# Altium schematic symbol library jlcpcb_2025_04_inductors_extended_0402.schlib: 1396 symbols (part 4 of 8) (continued)
## MGCI1005T8N2JT-LF
designator L?  Inductance: 8.2nH
Inductor, 8.2nH, ±5%, 350mΩ, 300mA, SMD 0402; Manufacturer: microgate; Manufacturer Part Number: MGCI1005T8N2JT-LF; Package Size: 0402; JLCPCB Basic Part: No; JLCPCB Part Number: C310873; Supplier 1: LCSC; Category: Inductors; Supplier Part Number 1: C310873; Tolerance: ±5%; Rated Current: 300mA; DC Resistance: 350mΩ; RoHS: Yes; ComponentLink1Description: Datasheet; ComponentLink1URL: https://wmsc.lcsc.com/wmsc/upload/file/pdf/v2/lcsc/2304140030_microgate-MGCI1005T8N2JT-LF_C310873.pdf; ComponentLink2Description: JLCPCB Part URL; ComponentLink2URL: https://jlcpcb.com/partdetail/C310873; ComponentLink3Description: LCSC Part URL; ComponentLink3URL: https://lcsc.com/product-detail/Inductors-SMD_microgate-microgate-MGCI1005T8N2JT-LF_C310873.html
footprint IND-0402 (0402 (1005M) Inductor)
pins: 1, 2

## MGCI1005T8N2ST-LF
designator L?  Inductance: 8.2nH
Inductor, 8.2nH, 350mΩ, 300mA, SMD 0402; Manufacturer: microgate; Manufacturer Part Number: MGCI1005T8N2ST-LF; Package Size: 0402; JLCPCB Basic Part: No; JLCPCB Part Number: C281010; Supplier 1: LCSC; Category: Inductors; Supplier Part Number 1: C281010; Rated Current: 300mA; DC Resistance: 350mΩ; RoHS: Yes; ComponentLink1Description: Datasheet; ComponentLink1URL: https://wmsc.lcsc.com/wmsc/upload/file/pdf/v2/lcsc/2304140030_microgate-MGCI1005T8N2ST-LF_C281010.pdf; ComponentLink2Description: JLCPCB Part URL; ComponentLink2URL: https://jlcpcb.com/partdetail/C281010; ComponentLink3Description: LCSC Part URL; ComponentLink3URL: https://lcsc.com/product-detail/Inductors-SMD_microgate-microgate-MGCI1005T8N2ST-LF_C281010.html
footprint IND-0402 (0402 (1005M) Inductor)
pins: 1, 2

## MGCI1005T9N1JT-LF
designator L?  Inductance: 9.1nH
Inductor, 9.1nH, ±5%, 420mΩ, 300mA, SMD 0402; Manufacturer: microgate; Manufacturer Part Number: MGCI1005T9N1JT-LF; Package Size: 0402; JLCPCB Basic Part: No; JLCPCB Part Number: C310874; Supplier 1: LCSC; Category: Inductors; Supplier Part Number 1: C310874; Tolerance: ±5%; Rated Current: 300mA; DC Resistance: 420mΩ; RoHS: Yes; ComponentLink1Description: Datasheet; ComponentLink1URL: https://wmsc.lcsc.com/wmsc/upload/file/pdf/v2/lcsc/2304140030_microgate-MGCI1005T9N1JT-LF_C310874.pdf; ComponentLink2Description: JLCPCB Part URL; ComponentLink2URL: https://jlcpcb.com/partdetail/C310874; ComponentLink3Description: LCSC Part URL; ComponentLink3URL: https://lcsc.com/product-detail/Inductors-SMD_microgate-microgate-MGCI1005T9N1JT-LF_C310874.html
footprint IND-0402 (0402 (1005M) Inductor)
pins: 1, 2

## MGCI1005T9N1ST-LF
designator L?  Inductance: 9.1nH
Inductor, 9.1nH, 420mΩ, 300mA, SMD 0402; Manufacturer: microgate; Manufacturer Part Number: MGCI1005T9N1ST-LF; Package Size: 0402; JLCPCB Basic Part: No; JLCPCB Part Number: C281011; Supplier 1: LCSC; Category: Inductors; Supplier Part Number 1: C281011; Rated Current: 300mA; DC Resistance: 420mΩ; RoHS: Yes; ComponentLink1Description: Datasheet; ComponentLink1URL: https://wmsc.lcsc.com/wmsc/upload/file/pdf/v2/lcsc/2304140030_microgate-MGCI1005T9N1ST-LF_C281011.pdf; ComponentLink2Description: JLCPCB Part URL; ComponentLink2URL: https://jlcpcb.com/partdetail/C281011; ComponentLink3Description: LCSC Part URL; ComponentLink3URL: https://lcsc.com/product-detail/Inductors-SMD_microgate-microgate-MGCI1005T9N1ST-LF_C281011.html
footprint IND-0402 (0402 (1005M) Inductor)
pins: 1, 2

## MGCI1005T10NJT-LF
designator L?  Inductance: 10nH
Inductor, 10nH, ±5%, 420mΩ, 300mA, SMD 0402; Manufacturer: microgate; Manufacturer Part Number: MGCI1005T10NJT-LF; Package Size: 0402; JLCPCB Basic Part: No; JLCPCB Part Number: C280981; Supplier 1: LCSC; Category: Inductors; Supplier Part Number 1: C280981; Tolerance: ±5%; Rated Current: 300mA; DC Resistance: 420mΩ; RoHS: Yes; ComponentLink1Description: Datasheet; ComponentLink1URL: https://wmsc.lcsc.com/wmsc/upload/file/pdf/v2/lcsc/2304140030_microgate-MGCI1005T10NJT-LF_C280981.pdf; ComponentLink2Description: JLCPCB Part URL; ComponentLink2URL: https://jlcpcb.com/partdetail/C280981; ComponentLink3Description: LCSC Part URL; ComponentLink3URL: https://lcsc.com/product-detail/Inductors-SMD_microgate-microgate-MGCI1005T10NJT-LF_C280981.html
footprint IND-0402 (0402 (1005M) Inductor)
pins: 1, 2

## MGCI1005T15NJT-LF
designator L?  Inductance: 15nH
Inductor, 15nH, ±5%, 600mΩ, 300mA, SMD 0402; Manufacturer: microgate; Manufacturer Part Number: MGCI1005T15NJT-LF; Package Size: 0402; JLCPCB Basic Part: No; JLCPCB Part Number: C280983; Supplier 1: LCSC; Category: Inductors; Supplier Part Number 1: C280983; Tolerance: ±5%; Rated Current: 300mA; DC Resistance: 600mΩ; RoHS: Yes; ComponentLink1Description: Datasheet; ComponentLink1URL: https://wmsc.lcsc.com/wmsc/upload/file/pdf/v2/lcsc/2304140030_microgate-MGCI1005T15NJT-LF_C280983.pdf; ComponentLink2Description: JLCPCB Part URL; ComponentLink2URL: https://jlcpcb.com/partdetail/C280983; ComponentLink3Description: LCSC Part URL; ComponentLink3URL: https://lcsc.com/product-detail/Inductors-SMD_microgate-microgate-MGCI1005T15NJT-LF_C280983.html
footprint IND-0402 (0402 (1005M) Inductor)
pins: 1, 2

## MGCI1005T22NJT-LF
designator L?  Inductance: 22nH
Inductor, 22nH, ±5%, 850mΩ, 300mA, SMD 0402; Manufacturer: microgate; Manufacturer Part Number: MGCI1005T22NJT-LF; Package Size: 0402; JLCPCB Basic Part: No; JLCPCB Part Number: C280989; Supplier 1: LCSC; Category: Inductors; Supplier Part Number 1: C280989; Tolerance: ±5%; Rated Current: 300mA; DC Resistance: 850mΩ; RoHS: Yes; ComponentLink1Description: Datasheet; ComponentLink1URL: https://wmsc.lcsc.com/wmsc/upload/file/pdf/v2/lcsc/2304140030_microgate-MGCI1005T22NJT-LF_C280989.pdf; ComponentLink2Description: JLCPCB Part URL; ComponentLink2URL: https://jlcpcb.com/partdetail/C280989; ComponentLink3Description: LCSC Part URL; ComponentLink3URL: https://lcsc.com/product-detail/Inductors-SMD_microgate-microgate-MGCI1005T22NJT-LF_C280989.html
footprint IND-0402 (0402 (1005M) Inductor)
pins: 1, 2

## MGCI1005T27NJT-LF
designator L?  Inductance: 27nH
Inductor, 27nH, ±5%, 1Ω, 300mA, SMD 0402; Manufacturer: microgate; Manufacturer Part Number: MGCI1005T27NJT-LF; Package Size: 0402; JLCPCB Basic Part: No; JLCPCB Part Number: C280990; Supplier 1: LCSC; Category: Inductors; Supplier Part Number 1: C280990; Tolerance: ±5%; Rated Current: 300mA; DC Resistance: 1Ω; RoHS: Yes; ComponentLink1Description: Datasheet; ComponentLink1URL: https://wmsc.lcsc.com/wmsc/upload/file/pdf/v2/lcsc/2304140030_microgate-MGCI1005T27NJT-LF_C280990.pdf; ComponentLink2Description: JLCPCB Part URL; ComponentLink2URL: https://jlcpcb.com/partdetail/C280990; ComponentLink3Description: LCSC Part URL; ComponentLink3URL: https://lcsc.com/product-detail/Inductors-SMD_microgate-microgate-MGCI1005T27NJT-LF_C280990.html
footprint IND-0402 (0402 (1005M) Inductor)
pins: 1, 2

## MGCI1005T33NJT-LF
designator L?  Inductance: 33nH
Inductor, 33nH, ±5%, 1Ω, 200mA, SMD 0402; Manufacturer: microgate; Manufacturer Part Number: MGCI1005T33NJT-LF; Package Size: 0402; JLCPCB Basic Part: No; JLCPCB Part Number: C486325; Supplier 1: LCSC; Category: Inductors; Supplier Part Number 1: C486325; Tolerance: ±5%; Rated Current: 200mA; DC Resistance: 1Ω; RoHS: Yes; ComponentLink1Description: Datasheet; ComponentLink1URL: https://wmsc.lcsc.com/wmsc/upload/file/pdf/v2/lcsc/2304140030_microgate-MGCI1005T33NJT-LF_C486325.pdf; ComponentLink2Description: JLCPCB Part URL; ComponentLink2URL: https://jlcpcb.com/partdetail/C486325; ComponentLink3Description: LCSC Part URL; ComponentLink3URL: https://lcsc.com/product-detail/Inductors-SMD_microgate-microgate-MGCI1005T33NJT-LF_C486325.html
footprint IND-0402 (0402 (1005M) Inductor)
pins: 1, 2

## MGCI1005T39NJT-LF
designator L?  Inductance: 39nH
Inductor, 39nH, ±5%, 1.3Ω, 200mA, SMD 0402; Manufacturer: microgate; Manufacturer Part Number: MGCI1005T39NJT-LF; Package Size: 0402; JLCPCB Basic Part: No; JLCPCB Part Number: C280995; Supplier 1: LCSC; Category: Inductors; Supplier Part Number 1: C280995; Tolerance: ±5%; Rated Current: 200mA; DC Resistance: 1.3Ω; RoHS: Yes; ComponentLink1Description: Datasheet; ComponentLink1URL: https://wmsc.lcsc.com/wmsc/upload/file/pdf/v2/lcsc/2304140030_microgate-MGCI1005T39NJT-LF_C280995.pdf; ComponentLink2Description: JLCPCB Part URL; ComponentLink2URL: https://jlcpcb.com/partdetail/C280995; ComponentLink3Description: LCSC Part URL; ComponentLink3URL: https://lcsc.com/product-detail/Inductors-SMD_microgate-microgate-MGCI1005T39NJT-LF_C280995.html
footprint IND-0402 (0402 (1005M) Inductor)
pins: 1, 2

## MGCI1005T56NJT-LF
designator L?  Inductance: 56nH
Inductor, 56nH, ±5%, 1.8Ω, 200mA, SMD 0402; Manufacturer: microgate; Manufacturer Part Number: MGCI1005T56NJT-LF; Package Size: 0402; JLCPCB Basic Part: No; JLCPCB Part Number: C281002; Supplier 1: LCSC; Category: Inductors; Supplier Part Number 1: C281002; Tolerance: ±5%; Rated Current: 200mA; DC Resistance: 1.8Ω; RoHS: Yes; ComponentLink1Description: Datasheet; ComponentLink1URL: https://wmsc.lcsc.com/wmsc/upload/file/pdf/v2/lcsc/2304140030_microgate-MGCI1005T56NJT-LF_C281002.pdf; ComponentLink2Description: JLCPCB Part URL; ComponentLink2URL: https://jlcpcb.com/partdetail/C281002; ComponentLink3Description: LCSC Part URL; ComponentLink3URL: https://lcsc.com/product-detail/Inductors-SMD_microgate-microgate-MGCI1005T56NJT-LF_C281002.html
footprint IND-0402 (0402 (1005M) Inductor)
pins: 1, 2

## MGCI1005T68NJT-LF
designator L?  Inductance: 68nH
Inductor, 68nH, ±5%, 1.95Ω, 180mA, SMD 0402; Manufacturer: microgate; Manufacturer Part Number: MGCI1005T68NJT-LF; Package Size: 0402; JLCPCB Basic Part: No; JLCPCB Part Number: C281005; Supplier 1: LCSC; Category: Inductors; Supplier Part Number 1: C281005; Tolerance: ±5%; Rated Current: 180mA; DC Resistance: 1.95Ω; RoHS: Yes; ComponentLink1Description: Datasheet; ComponentLink1URL: https://wmsc.lcsc.com/wmsc/upload/file/pdf/v2/lcsc/2304140030_microgate-MGCI1005T68NJT-LF_C281005.pdf; ComponentLink2Description: JLCPCB Part URL; ComponentLink2URL: https://jlcpcb.com/partdetail/C281005; ComponentLink3Description: LCSC Part URL; ComponentLink3URL: https://lcsc.com/product-detail/Inductors-SMD_microgate-microgate-MGCI1005T68NJT-LF_C281005.html
footprint IND-0402 (0402 (1005M) Inductor)
pins: 1, 2

## MGCI1005T82NJT-LF
designator L?  Inductance: 82nH
Inductor, 82nH, ±5%, 2.1Ω, 150mA, SMD 0402; Manufacturer: microgate; Manufacturer Part Number: MGCI1005T82NJT-LF; Package Size: 0402; JLCPCB Basic Part: No; JLCPCB Part Number: C281009; Supplier 1: LCSC; Category: Inductors; Supplier Part Number 1: C281009; Tolerance: ±5%; Rated Current: 150mA; DC Resistance: 2.1Ω; RoHS: Yes; ComponentLink1Description: Datasheet; ComponentLink1URL: https://wmsc.lcsc.com/wmsc/upload/file/pdf/v2/lcsc/2304140030_microgate-MGCI1005T82NJT-LF_C281009.pdf; ComponentLink2Description: JLCPCB Part URL; ComponentLink2URL: https://jlcpcb.com/partdetail/C281009; ComponentLink3Description: LCSC Part URL; ComponentLink3URL: https://lcsc.com/product-detail/Inductors-SMD_microgate-microgate-MGCI1005T82NJT-LF_C281009.html
footprint IND-0402 (0402 (1005M) Inductor)
pins: 1, 2

## MGCI1005TR10JT-LF
designator L?  Inductance: 100nH
Inductor, 100nH, ±5%, 2.5Ω, 150mA, SMD 0402; Manufacturer: microgate; Manufacturer Part Number: MGCI1005TR10JT-LF; Package Size: 0402; JLCPCB Basic Part: No; JLCPCB Part Number: C281012; Supplier 1: LCSC; Category: Inductors; Supplier Part Number 1: C281012; Tolerance: ±5%; Rated Current: 150mA; DC Resistance: 2.5Ω; RoHS: Yes; ComponentLink1Description: Datasheet; ComponentLink1URL: https://wmsc.lcsc.com/wmsc/upload/file/pdf/v2/lcsc/2304140030_microgate-MGCI1005TR10JT-LF_C281012.pdf; ComponentLink2Description: JLCPCB Part URL; ComponentLink2URL: https://jlcpcb.com/partdetail/C281012; ComponentLink3Description: LCSC Part URL; ComponentLink3URL: https://lcsc.com/product-detail/Inductors-SMD_microgate-microgate-MGCI1005TR10JT-LF_C281012.html
footprint IND-0402 (0402 (1005M) Inductor)
pins: 1, 2

## MGCI1005TR12JT-LF
designator L?  Inductance: 120nH
Inductor, 120nH, ±5%, 2.8Ω, 150mA, SMD 0402; Manufacturer: microgate; Manufacturer Part Number: MGCI1005TR12JT-LF; Package Size: 0402; JLCPCB Basic Part: No; JLCPCB Part Number: C281013; Supplier 1: LCSC; Category: Inductors; Supplier Part Number 1: C281013; Tolerance: ±5%; Rated Current: 150mA; DC Resistance: 2.8Ω; RoHS: Yes; ComponentLink1Description: Datasheet; ComponentLink1URL: https://wmsc.lcsc.com/wmsc/upload/file/pdf/v2/lcsc/2304140030_microgate-MGCI1005TR12JT-LF_C281013.pdf; ComponentLink2Description: JLCPCB Part URL; ComponentLink2URL: https://jlcpcb.com/partdetail/C281013; ComponentLink3Description: LCSC Part URL; ComponentLink3URL: https://lcsc.com/product-detail/Inductors-SMD_microgate-microgate-MGCI1005TR12JT-LF_C281013.html
footprint IND-0402 (0402 (1005M) Inductor)
pins: 1, 2

## MGCI1005TR15JT-LF
designator L?  Inductance: 150nH
Inductor, 150nH, ±5%, 2.35Ω, 150mA, SMD 0402; Manufacturer: microgate; Manufacturer Part Number: MGCI1005TR15JT-LF; Package Size: 0402; JLCPCB Basic Part: No; JLCPCB Part Number: C486326; Supplier 1: LCSC; Category: Inductors; Supplier Part Number 1: C486326; Tolerance: ±5%; Rated Current: 150mA; DC Resistance: 2.35Ω; RoHS: Yes; ComponentLink1Description: Datasheet; ComponentLink1URL: https://wmsc.lcsc.com/wmsc/upload/file/pdf/v2/lcsc/2002201432_microgate-MGCI1005TR15JT-LF_C486326.pdf; ComponentLink2Description: JLCPCB Part URL; ComponentLink2URL: https://jlcpcb.com/partdetail/C486326; ComponentLink3Description: LCSC Part URL; ComponentLink3URL: https://lcsc.com/product-detail/Inductors-SMD_microgate-microgate-MGCI1005TR15JT-LF_C486326.html
footprint IND-0402 (0402 (1005M) Inductor)
pins: 1, 2

## MGCI1005TR18JT-LF
designator L?  Inductance: 180nH
Inductor, 180nH, ±5%, 2.55Ω, 100mA, SMD 0402; Manufacturer: microgate; Manufacturer Part Number: MGCI1005TR18JT-LF; Package Size: 0402; JLCPCB Basic Part: No; JLCPCB Part Number: C281014; Supplier 1: LCSC; Category: Inductors; Supplier Part Number 1: C281014; Tolerance: ±5%; Rated Current: 100mA; DC Resistance: 2.55Ω; RoHS: Yes; ComponentLink1Description: Datasheet; ComponentLink1URL: https://wmsc.lcsc.com/wmsc/upload/file/pdf/v2/lcsc/2304140030_microgate-MGCI1005TR18JT-LF_C281014.pdf; ComponentLink2Description: JLCPCB Part URL; ComponentLink2URL: https://jlcpcb.com/partdetail/C281014; ComponentLink3Description: LCSC Part URL; ComponentLink3URL: https://lcsc.com/product-detail/Inductors-SMD_microgate-microgate-MGCI1005TR18JT-LF_C281014.html
footprint IND-0402 (0402 (1005M) Inductor)
pins: 1, 2

## MGCI1005TR22JT-LF
designator L?  Inductance: 220nH
Inductor, 220nH, ±5%, 2.65Ω, 100mA, SMD 0402; Manufacturer: microgate; Manufacturer Part Number: MGCI1005TR22JT-LF; Package Size: 0402; JLCPCB Basic Part: No; JLCPCB Part Number: C281015; Supplier 1: LCSC; Category: Inductors; Supplier Part Number 1: C281015; Tolerance: ±5%; Rated Current: 100mA; DC Resistance: 2.65Ω; RoHS: Yes; ComponentLink1Description: Datasheet; ComponentLink1URL: https://wmsc.lcsc.com/wmsc/upload/file/pdf/v2/lcsc/2304140030_microgate-MGCI1005TR22JT-LF_C281015.pdf; ComponentLink2Description: JLCPCB Part URL; ComponentLink2URL: https://jlcpcb.com/partdetail/C281015; ComponentLink3Description: LCSC Part URL; ComponentLink3URL: https://lcsc.com/product-detail/Inductors-SMD_microgate-microgate-MGCI1005TR22JT-LF_C281015.html
footprint IND-0402 (0402 (1005M) Inductor)
pins: 1, 2

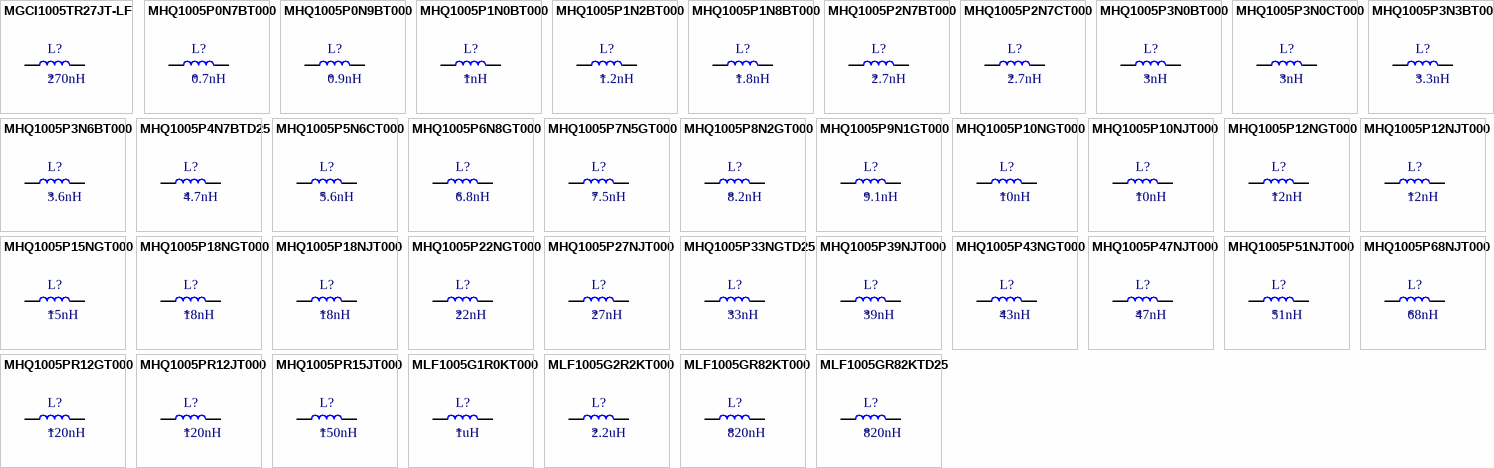
[diagram p18: symbols MGCI1005TR27JT-LF to MLF1005GR82KTD25]

## MGCI1005TR27JT-LF
designator L?  Inductance: 270nH
Inductor, 270nH, ±5%, 2.85Ω, 50mA, SMD 0402; Manufacturer: microgate; Manufacturer Part Number: MGCI1005TR27JT-LF; Package Size: 0402; JLCPCB Basic Part: No; JLCPCB Part Number: C281016; Supplier 1: LCSC; Category: Inductors; Supplier Part Number 1: C281016; Tolerance: ±5%; Rated Current: 50mA; DC Resistance: 2.85Ω; RoHS: Yes; ComponentLink1Description: Datasheet; ComponentLink1URL: https://wmsc.lcsc.com/wmsc/upload/file/pdf/v2/lcsc/2304140030_microgate-MGCI1005TR27JT-LF_C281016.pdf; ComponentLink2Description: JLCPCB Part URL; ComponentLink2URL: https://jlcpcb.com/partdetail/C281016; ComponentLink3Description: LCSC Part URL; ComponentLink3URL: https://lcsc.com/product-detail/Inductors-SMD_microgate-microgate-MGCI1005TR27JT-LF_C281016.html
footprint IND-0402 (0402 (1005M) Inductor)
pins: 1, 2

## MHQ1005P0N7BT000
designator L?  Inductance: 0.7nH
Inductor, 0.7nH, 10mΩ, 1.2A, SMD 0402; Manufacturer: TDK; Manufacturer Part Number: MHQ1005P0N7BT000; Self-Resonant Frequency: 18.3GHz; Package Size: 0402; JLCPCB Basic Part: No; JLCPCB Part Number: C307689; Supplier 1: LCSC; Category: Inductors; Supplier Part Number 1: C307689; Rated Current: 1.2A; DC Resistance: 10mΩ; RoHS: Yes; ComponentLink1Description: Datasheet; ComponentLink1URL: https://wmsc.lcsc.com/wmsc/upload/file/pdf/v2/lcsc/2304140030_TDK-MHQ1005P0N7BT000_C307689.pdf; ComponentLink2Description: JLCPCB Part URL; ComponentLink2URL: https://jlcpcb.com/partdetail/C307689; ComponentLink3Description: LCSC Part URL; ComponentLink3URL: https://lcsc.com/product-detail/Inductors-SMD_TDK-TDK-MHQ1005P0N7BT000_C307689.html
footprint IND-0402 (0402 (1005M) Inductor)
pins: 1, 2

## MHQ1005P0N9BT000
designator L?  Inductance: 0.9nH
Inductor, 0.9nH, 10mΩ, 1.2A, SMD 0402; Manufacturer: TDK; Manufacturer Part Number: MHQ1005P0N9BT000; Self-Resonant Frequency: 15GHz; Package Size: 0402; JLCPCB Basic Part: No; JLCPCB Part Number: C695587; Supplier 1: LCSC; Category: Inductors; Supplier Part Number 1: C695587; Rated Current: 1.2A; DC Resistance: 10mΩ; RoHS: Yes; ComponentLink1Description: Datasheet; ComponentLink1URL: https://wmsc.lcsc.com/wmsc/upload/file/pdf/v2/lcsc/2304140030_TDK-MHQ1005P0N9BT000_C695587.pdf; ComponentLink2Description: JLCPCB Part URL; ComponentLink2URL: https://jlcpcb.com/partdetail/C695587; ComponentLink3Description: LCSC Part URL; ComponentLink3URL: https://lcsc.com/product-detail/Inductors-SMD_TDK-TDK-MHQ1005P0N9BT000_C695587.html
footprint IND-0402 (0402 (1005M) Inductor)
pins: 1, 2

## MHQ1005P1N0BT000
designator L?  Inductance: 1nH
Inductor, 1nH, 10mΩ, 1.2A, SMD 0402; Manufacturer: TDK; Manufacturer Part Number: MHQ1005P1N0BT000; Self-Resonant Frequency: 15GHz; Package Size: 0402; JLCPCB Basic Part: No; JLCPCB Part Number: C433003; Supplier 1: LCSC; Category: Inductors; Supplier Part Number 1: C433003; Rated Current: 1.2A; DC Resistance: 10mΩ; RoHS: Yes; ComponentLink1Description: Datasheet; ComponentLink1URL: https://wmsc.lcsc.com/wmsc/upload/file/pdf/v2/lcsc/2304140030_TDK-MHQ1005P1N0BT000_C433003.pdf; ComponentLink2Description: JLCPCB Part URL; ComponentLink2URL: https://jlcpcb.com/partdetail/C433003; ComponentLink3Description: LCSC Part URL; ComponentLink3URL: https://lcsc.com/product-detail/Inductors-SMD_TDK-TDK-MHQ1005P1N0BT000_C433003.html
footprint IND-0402 (0402 (1005M) Inductor)
pins: 1, 2

## MHQ1005P1N2BT000
designator L?  Inductance: 1.2nH
Inductor, 1.2nH, 10mΩ, 1.2A, SMD 0402; Manufacturer: TDK; Manufacturer Part Number: MHQ1005P1N2BT000; Self-Resonant Frequency: 13GHz; Package Size: 0402; JLCPCB Basic Part: No; JLCPCB Part Number: C445745; Supplier 1: LCSC; Category: Inductors; Supplier Part Number 1: C445745; Rated Current: 1.2A; DC Resistance: 10mΩ; RoHS: Yes; ComponentLink1Description: Datasheet; ComponentLink1URL: https://wmsc.lcsc.com/wmsc/upload/file/pdf/v2/lcsc/2304140030_TDK-MHQ1005P1N2BT000_C445745.pdf; ComponentLink2Description: JLCPCB Part URL; ComponentLink2URL: https://jlcpcb.com/partdetail/C445745; ComponentLink3Description: LCSC Part URL; ComponentLink3URL: https://lcsc.com/product-detail/Inductors-SMD_TDK-TDK-MHQ1005P1N2BT000_C445745.html
footprint IND-0402 (0402 (1005M) Inductor)
pins: 1, 2

## MHQ1005P1N8BT000
designator L?  Inductance: 1.8nH
Inductor, 1.8nH, 30mΩ, 1A, SMD 0402; Manufacturer: TDK; Manufacturer Part Number: MHQ1005P1N8BT000; Self-Resonant Frequency: 9GHz; Q Factor: 23@250MHz; Package Size: 0402; JLCPCB Basic Part: No; JLCPCB Part Number: C531405; Supplier 1: LCSC; Category: Inductors; Supplier Part Number 1: C531405; Rated Current: 1A; DC Resistance: 30mΩ; RoHS: Yes; ComponentLink1Description: Datasheet; ComponentLink1URL: https://wmsc.lcsc.com/wmsc/upload/file/pdf/v2/lcsc/2401221724_TDK-MHQ1005P1N8BT000_C531405.pdf; ComponentLink2Description: JLCPCB Part URL; ComponentLink2URL: https://jlcpcb.com/partdetail/C531405; ComponentLink3Description: LCSC Part URL; ComponentLink3URL: https://lcsc.com/product-detail/Inductors-SMD_TDK-TDK-MHQ1005P1N8BT000_C531405.html
footprint IND-0402 (0402 (1005M) Inductor)
pins: 1, 2

## MHQ1005P2N7BT000
designator L?  Inductance: 2.7nH
Inductor, 2.7nH, 40mΩ, 900mA, SMD 0402; Manufacturer: TDK; Manufacturer Part Number: MHQ1005P2N7BT000; Self-Resonant Frequency: 9.6GHz; Q Factor: 23@250MHz; Package Size: 0402; JLCPCB Basic Part: No; JLCPCB Part Number: C434826; Supplier 1: LCSC; Category: Inductors; Supplier Part Number 1: C434826; Rated Current: 900mA; DC Resistance: 40mΩ; RoHS: Yes; ComponentLink1Description: Datasheet; ComponentLink1URL: https://wmsc.lcsc.com/wmsc/upload/file/pdf/v2/lcsc/2304140030_TDK-MHQ1005P2N7BT000_C434826.pdf; ComponentLink2Description: JLCPCB Part URL; ComponentLink2URL: https://jlcpcb.com/partdetail/C434826; ComponentLink3Description: LCSC Part URL; ComponentLink3URL: https://lcsc.com/product-detail/Inductors-SMD_TDK-TDK-MHQ1005P2N7BT000_C434826.html
footprint IND-0402 (0402 (1005M) Inductor)
pins: 1, 2

## MHQ1005P2N7CT000
designator L?  Inductance: 2.7nH
Inductor, 2.7nH, 40mΩ, 900mA, SMD 0402; Manufacturer: TDK; Manufacturer Part Number: MHQ1005P2N7CT000; Self-Resonant Frequency: 6.5GHz; Q Factor: 23@250MHz; Package Size: 0402; JLCPCB Basic Part: No; JLCPCB Part Number: C434841; Supplier 1: LCSC; Category: Inductors; Supplier Part Number 1: C434841; Rated Current: 900mA; DC Resistance: 40mΩ; RoHS: Yes; ComponentLink1Description: Datasheet; ComponentLink1URL: https://wmsc.lcsc.com/wmsc/upload/file/pdf/v2/lcsc/2304140030_TDK-MHQ1005P2N7CT000_C434841.pdf; ComponentLink2Description: JLCPCB Part URL; ComponentLink2URL: https://jlcpcb.com/partdetail/C434841; ComponentLink3Description: LCSC Part URL; ComponentLink3URL: https://lcsc.com/product-detail/Inductors-SMD_TDK-TDK-MHQ1005P2N7CT000_C434841.html
footprint IND-0402 (0402 (1005M) Inductor)
pins: 1, 2

## MHQ1005P3N0BT000
designator L?  Inductance: 3nH
Inductor, 3nH, 60mΩ, 900mA, SMD 0402; Manufacturer: TDK; Manufacturer Part Number: MHQ1005P3N0BT000; Self-Resonant Frequency: 6GHz; Q Factor: 23@250MHz; Package Size: 0402; JLCPCB Basic Part: No; JLCPCB Part Number: C433005; Supplier 1: LCSC; Category: Inductors; Supplier Part Number 1: C433005; Rated Current: 900mA; DC Resistance: 60mΩ; RoHS: Yes; ComponentLink1Description: Datasheet; ComponentLink1URL: https://wmsc.lcsc.com/wmsc/upload/file/pdf/v2/lcsc/2304140030_TDK-MHQ1005P3N0BT000_C433005.pdf; ComponentLink2Description: JLCPCB Part URL; ComponentLink2URL: https://jlcpcb.com/partdetail/C433005; ComponentLink3Description: LCSC Part URL; ComponentLink3URL: https://lcsc.com/product-detail/Inductors-SMD_TDK-TDK-MHQ1005P3N0BT000_C433005.html
footprint IND-0402 (0402 (1005M) Inductor)
pins: 1, 2

## MHQ1005P3N0CT000
designator L?  Inductance: 3nH
Inductor, 3nH, 60mΩ, 900mA, SMD 0402; Manufacturer: TDK; Manufacturer Part Number: MHQ1005P3N0CT000; Self-Resonant Frequency: 6GHz; Q Factor: 23@250MHz; Package Size: 0402; JLCPCB Basic Part: No; JLCPCB Part Number: C445744; Supplier 1: LCSC; Category: Inductors; Supplier Part Number 1: C445744; Rated Current: 900mA; DC Resistance: 60mΩ; RoHS: Yes; ComponentLink1Description: Datasheet; ComponentLink1URL: https://wmsc.lcsc.com/wmsc/upload/file/pdf/v2/lcsc/2304140030_TDK-MHQ1005P3N0CT000_C445744.pdf; ComponentLink2Description: JLCPCB Part URL; ComponentLink2URL: https://jlcpcb.com/partdetail/C445744; ComponentLink3Description: LCSC Part URL; ComponentLink3URL: https://lcsc.com/product-detail/Inductors-SMD_TDK-TDK-MHQ1005P3N0CT000_C445744.html
footprint IND-0402 (0402 (1005M) Inductor)
pins: 1, 2

## MHQ1005P3N3BT000
designator L?  Inductance: 3.3nH
Inductor, 3.3nH, 60mΩ, 900mA, SMD 0402; Manufacturer: TDK; Manufacturer Part Number: MHQ1005P3N3BT000; Self-Resonant Frequency: 9GHz; Q Factor: 23@250MHz; Package Size: 0402; JLCPCB Basic Part: No; JLCPCB Part Number: C531332; Supplier 1: LCSC; Category: Inductors; Supplier Part Number 1: C531332; Rated Current: 900mA; DC Resistance: 60mΩ; RoHS: Yes; ComponentLink1Description: Datasheet; ComponentLink1URL: https://wmsc.lcsc.com/wmsc/upload/file/pdf/v2/lcsc/2304140030_TDK-MHQ1005P3N3BT000_C531332.pdf; ComponentLink2Description: JLCPCB Part URL; ComponentLink2URL: https://jlcpcb.com/partdetail/C531332; ComponentLink3Description: LCSC Part URL; ComponentLink3URL: https://lcsc.com/product-detail/Inductors-SMD_TDK-TDK-MHQ1005P3N3BT000_C531332.html
footprint IND-0402 (0402 (1005M) Inductor)
pins: 1, 2

## MHQ1005P3N6BT000
designator L?  Inductance: 3.6nH
Inductor, 3.6nH, 70mΩ, 900mA, SMD 0402; Manufacturer: TDK; Manufacturer Part Number: MHQ1005P3N6BT000; Self-Resonant Frequency: 5.5GHz; Q Factor: 23@250MHz; Package Size: 0402; JLCPCB Basic Part: No; JLCPCB Part Number: C531406; Supplier 1: LCSC; Category: Inductors; Supplier Part Number 1: C531406; Rated Current: 900mA; DC Resistance: 70mΩ; RoHS: Yes; ComponentLink1Description: Datasheet; ComponentLink1URL: https://wmsc.lcsc.com/wmsc/upload/file/pdf/v2/lcsc/2401221724_TDK-MHQ1005P3N6BT000_C531406.pdf; ComponentLink2Description: JLCPCB Part URL; ComponentLink2URL: https://jlcpcb.com/partdetail/C531406; ComponentLink3Description: LCSC Part URL; ComponentLink3URL: https://lcsc.com/product-detail/Inductors-SMD_TDK-TDK-MHQ1005P3N6BT000_C531406.html
footprint IND-0402 (0402 (1005M) Inductor)
pins: 1, 2

## MHQ1005P4N7BTD25
designator L?  Inductance: 4.7nH
Inductor, 4.7nH, 80mΩ, 800mA, SMD 0402; Manufacturer: TDK; Manufacturer Part Number: MHQ1005P4N7BTD25; Self-Resonant Frequency: 5GHz; Q Factor: 23@250MHz; Package Size: 0402; JLCPCB Basic Part: No; JLCPCB Part Number: C2048654; Supplier 1: LCSC; Category: Inductors; Supplier Part Number 1: C2048654; Rated Current: 800mA; DC Resistance: 80mΩ; RoHS: Yes; ComponentLink1Description: Datasheet; ComponentLink1URL: https://wmsc.lcsc.com/wmsc/upload/file/pdf/v2/lcsc/2304140030_TDK-MHQ1005P4N7BTD25_C2048654.pdf; ComponentLink2Description: JLCPCB Part URL; ComponentLink2URL: https://jlcpcb.com/partdetail/C2048654; ComponentLink3Description: LCSC Part URL; ComponentLink3URL: https://lcsc.com/product-detail/Inductors-SMD_TDK-TDK-MHQ1005P4N7BTD25_C2048654.html
footprint IND-0402 (0402 (1005M) Inductor)
pins: 1, 2

## MHQ1005P5N6CT000
designator L?  Inductance: 5.6nH
Inductor, 5.6nH, 100mΩ, 800mA, SMD 0402; Manufacturer: TDK; Manufacturer Part Number: MHQ1005P5N6CT000; Self-Resonant Frequency: 4.5GHz; Q Factor: 23@250MHz; Package Size: 0402; JLCPCB Basic Part: No; JLCPCB Part Number: C2050782; Supplier 1: LCSC; Category: Inductors; Supplier Part Number 1: C2050782; Rated Current: 800mA; DC Resistance: 100mΩ; RoHS: Yes; ComponentLink1Description: Datasheet; ComponentLink1URL: https://wmsc.lcsc.com/wmsc/upload/file/pdf/v2/lcsc/2304140030_TDK-MHQ1005P5N6CT000_C2050782.pdf; ComponentLink2Description: JLCPCB Part URL; ComponentLink2URL: https://jlcpcb.com/partdetail/C2050782; ComponentLink3Description: LCSC Part URL; ComponentLink3URL: https://lcsc.com/product-detail/Inductors-SMD_TDK-TDK-MHQ1005P5N6CT000_C2050782.html
footprint IND-0402 (0402 (1005M) Inductor)
pins: 1, 2

## MHQ1005P6N8GT000
designator L?  Inductance: 6.8nH
Inductor, 6.8nH, ±2%, 100mΩ, 700mA, SMD 0402; Manufacturer: TDK; Manufacturer Part Number: MHQ1005P6N8GT000; Self-Resonant Frequency: 5.8GHz; Q Factor: 23@250MHz; Package Size: 0402; JLCPCB Basic Part: No; JLCPCB Part Number: C445747; Supplier 1: LCSC; Category: Inductors; Supplier Part Number 1: C445747; Tolerance: ±2%; Rated Current: 700mA; DC Resistance: 100mΩ; RoHS: Yes; ComponentLink1Description: Datasheet; ComponentLink1URL: https://wmsc.lcsc.com/wmsc/upload/file/pdf/v2/lcsc/2304140030_TDK-MHQ1005P6N8GT000_C445747.pdf; ComponentLink2Description: JLCPCB Part URL; ComponentLink2URL: https://jlcpcb.com/partdetail/C445747; ComponentLink3Description: LCSC Part URL; ComponentLink3URL: https://lcsc.com/product-detail/Inductors-SMD_TDK-TDK-MHQ1005P6N8GT000_C445747.html
footprint IND-0402 (0402 (1005M) Inductor)
pins: 1, 2

## MHQ1005P7N5GT000
designator L?  Inductance: 7.5nH
Inductor, 7.5nH, ±2%, 120mΩ, 600mA, SMD 0402; Manufacturer: TDK; Manufacturer Part Number: MHQ1005P7N5GT000; Self-Resonant Frequency: 5.6GHz; Q Factor: 23@250MHz; Package Size: 0402; JLCPCB Basic Part: No; JLCPCB Part Number: C531336; Supplier 1: LCSC; Category: Inductors; Supplier Part Number 1: C531336; Tolerance: ±2%; Rated Current: 600mA; DC Resistance: 120mΩ; RoHS: Yes; ComponentLink1Description: Datasheet; ComponentLink1URL: https://wmsc.lcsc.com/wmsc/upload/file/pdf/v2/lcsc/2304140030_TDK-MHQ1005P7N5GT000_C531336.pdf; ComponentLink2Description: JLCPCB Part URL; ComponentLink2URL: https://jlcpcb.com/partdetail/C531336; ComponentLink3Description: LCSC Part URL; ComponentLink3URL: https://lcsc.com/product-detail/Inductors-SMD_TDK-TDK-MHQ1005P7N5GT000_C531336.html
footprint IND-0402 (0402 (1005M) Inductor)
pins: 1, 2

## MHQ1005P8N2GT000
designator L?  Inductance: 8.2nH
Inductor, 8.2nH, ±2%, 120mΩ, 550mA, SMD 0402; Manufacturer: TDK; Manufacturer Part Number: MHQ1005P8N2GT000; Self-Resonant Frequency: 3.6GHz; Q Factor: 23@250MHz; Package Size: 0402; JLCPCB Basic Part: No; JLCPCB Part Number: C413898; Supplier 1: LCSC; Category: Inductors; Supplier Part Number 1: C413898; Tolerance: ±2%; Rated Current: 550mA; DC Resistance: 120mΩ; RoHS: Yes; ComponentLink1Description: Datasheet; ComponentLink1URL: https://wmsc.lcsc.com/wmsc/upload/file/pdf/v2/lcsc/2304140030_TDK-MHQ1005P8N2GT000_C413898.pdf; ComponentLink2Description: JLCPCB Part URL; ComponentLink2URL: https://jlcpcb.com/partdetail/C413898; ComponentLink3Description: LCSC Part URL; ComponentLink3URL: https://lcsc.com/product-detail/Inductors-SMD_TDK-TDK-MHQ1005P8N2GT000_C413898.html
footprint IND-0402 (0402 (1005M) Inductor)
pins: 1, 2

## MHQ1005P9N1GT000
designator L?  Inductance: 9.1nH
Inductor, 9.1nH, ±2%, 130mΩ, 550mA, SMD 0402; Manufacturer: TDK; Manufacturer Part Number: MHQ1005P9N1GT000; Self-Resonant Frequency: 4.5GHz; Q Factor: 23@250MHz; Package Size: 0402; JLCPCB Basic Part: No; JLCPCB Part Number: C434847; Supplier 1: LCSC; Category: Inductors; Supplier Part Number 1: C434847; Tolerance: ±2%; Rated Current: 550mA; DC Resistance: 130mΩ; RoHS: Yes; ComponentLink1Description: Datasheet; ComponentLink1URL: https://wmsc.lcsc.com/wmsc/upload/file/pdf/v2/lcsc/2304140030_TDK-MHQ1005P9N1GT000_C434847.pdf; ComponentLink2Description: JLCPCB Part URL; ComponentLink2URL: https://jlcpcb.com/partdetail/C434847; ComponentLink3Description: LCSC Part URL; ComponentLink3URL: https://lcsc.com/product-detail/Inductors-SMD_TDK-TDK-MHQ1005P9N1GT000_C434847.html
footprint IND-0402 (0402 (1005M) Inductor)
pins: 1, 2

## MHQ1005P10NGT000
designator L?  Inductance: 10nH
Inductor, 10nH, ±2%, 150mΩ, 500mA, SMD 0402; Manufacturer: TDK; Manufacturer Part Number: MHQ1005P10NGT000; Self-Resonant Frequency: 3.3GHz; Q Factor: 23@250MHz; Package Size: 0402; JLCPCB Basic Part: No; JLCPCB Part Number: C382409; Supplier 1: LCSC; Category: Inductors; Supplier Part Number 1: C382409; Tolerance: ±2%; Rated Current: 500mA; DC Resistance: 150mΩ; RoHS: Yes; ComponentLink1Description: Datasheet; ComponentLink1URL: https://wmsc.lcsc.com/wmsc/upload/file/pdf/v2/lcsc/2304140030_TDK-MHQ1005P10NGT000_C382409.pdf; ComponentLink2Description: JLCPCB Part URL; ComponentLink2URL: https://jlcpcb.com/partdetail/C382409; ComponentLink3Description: LCSC Part URL; ComponentLink3URL: https://lcsc.com/product-detail/Inductors-SMD_TDK-TDK-MHQ1005P10NGT000_C382409.html
footprint IND-0402 (0402 (1005M) Inductor)
pins: 1, 2

## MHQ1005P10NJT000
designator L?  Inductance: 10nH
Inductor, 10nH, ±5%, 150mΩ, 500mA, SMD 0402; Manufacturer: TDK; Manufacturer Part Number: MHQ1005P10NJT000; Self-Resonant Frequency: 4.6GHz; Q Factor: 23@250MHz; Package Size: 0402; JLCPCB Basic Part: No; JLCPCB Part Number: C445746; Supplier 1: LCSC; Category: Inductors; Supplier Part Number 1: C445746; Tolerance: ±5%; Rated Current: 500mA; DC Resistance: 150mΩ; RoHS: Yes; ComponentLink1Description: Datasheet; ComponentLink1URL: https://wmsc.lcsc.com/wmsc/upload/file/pdf/v2/lcsc/2304140030_TDK-MHQ1005P10NJT000_C445746.pdf; ComponentLink2Description: JLCPCB Part URL; ComponentLink2URL: https://jlcpcb.com/partdetail/C445746; ComponentLink3Description: LCSC Part URL; ComponentLink3URL: https://lcsc.com/product-detail/Inductors-SMD_TDK-TDK-MHQ1005P10NJT000_C445746.html
footprint IND-0402 (0402 (1005M) Inductor)
pins: 1, 2

## MHQ1005P12NGT000
designator L?  Inductance: 12nH
Inductor, 12nH, ±2%, 240mΩ, 450mA, SMD 0402; Manufacturer: TDK; Manufacturer Part Number: MHQ1005P12NGT000; Self-Resonant Frequency: 2.8GHz; Q Factor: 23@250MHz; Package Size: 0402; JLCPCB Basic Part: No; JLCPCB Part Number: C3911363; Supplier 1: LCSC; Category: Inductors; Supplier Part Number 1: C3911363; Tolerance: ±2%; Rated Current: 450mA; DC Resistance: 240mΩ; RoHS: Yes; ComponentLink1Description: Datasheet; ComponentLink1URL: https://wmsc.lcsc.com/wmsc/upload/file/pdf/v2/lcsc/2401221719_TDK-MHQ1005P12NGT000_C3911363.pdf; ComponentLink2Description: JLCPCB Part URL; ComponentLink2URL: https://jlcpcb.com/partdetail/C3911363; ComponentLink3Description: LCSC Part URL; ComponentLink3URL: https://lcsc.com/product-detail/Inductors-SMD_TDK-TDK-MHQ1005P12NGT000_C3911363.html
footprint IND-0402 (0402 (1005M) Inductor)
pins: 1, 2

## MHQ1005P12NJT000
designator L?  Inductance: 12nH
Inductor, 12nH, ±5%, 190mΩ, 450mA, SMD 0402; Manufacturer: TDK; Manufacturer Part Number: MHQ1005P12NJT000; Self-Resonant Frequency: 3.8GHz; Q Factor: 23@250MHz; Package Size: 0402; JLCPCB Basic Part: No; JLCPCB Part Number: C695588; Supplier 1: LCSC; Category: Inductors; Supplier Part Number 1: C695588; Tolerance: ±5%; Rated Current: 450mA; DC Resistance: 190mΩ; RoHS: Yes; ComponentLink1Description: Datasheet; ComponentLink1URL: https://wmsc.lcsc.com/wmsc/upload/file/pdf/v2/lcsc/2304140030_TDK-MHQ1005P12NJT000_C695588.pdf; ComponentLink2Description: JLCPCB Part URL; ComponentLink2URL: https://jlcpcb.com/partdetail/C695588; ComponentLink3Description: LCSC Part URL; ComponentLink3URL: https://lcsc.com/product-detail/Inductors-SMD_TDK-TDK-MHQ1005P12NJT000_C695588.html
footprint IND-0402 (0402 (1005M) Inductor)
pins: 1, 2

## MHQ1005P15NGT000
designator L?  Inductance: 15nH
Inductor, 15nH, ±2%, 220mΩ, 400mA, SMD 0402; Manufacturer: TDK; Manufacturer Part Number: MHQ1005P15NGT000; Self-Resonant Frequency: 2.3GHz; Q Factor: 23@250MHz; Package Size: 0402; JLCPCB Basic Part: No; JLCPCB Part Number: C387862; Supplier 1: LCSC; Category: Inductors; Supplier Part Number 1: C387862; Tolerance: ±2%; Rated Current: 400mA; DC Resistance: 220mΩ; RoHS: Yes; ComponentLink1Description: Datasheet; ComponentLink1URL: https://wmsc.lcsc.com/wmsc/upload/file/pdf/v2/lcsc/2304140030_TDK-MHQ1005P15NGT000_C387862.pdf; ComponentLink2Description: JLCPCB Part URL; ComponentLink2URL: https://jlcpcb.com/partdetail/C387862; ComponentLink3Description: LCSC Part URL; ComponentLink3URL: https://lcsc.com/product-detail/Inductors-SMD_TDK-TDK-MHQ1005P15NGT000_C387862.html
footprint IND-0402 (0402 (1005M) Inductor)
pins: 1, 2

## MHQ1005P18NGT000
designator L?  Inductance: 18nH
Inductor, 18nH, ±2%, 480mΩ, 260mA, SMD 0402; Manufacturer: TDK; Manufacturer Part Number: MHQ1005P18NGT000; Self-Resonant Frequency: 2.3GHz; Q Factor: 22@250MHz; Package Size: 0402; JLCPCB Basic Part: No; JLCPCB Part Number: C695589; Supplier 1: LCSC; Category: Inductors; Supplier Part Number 1: C695589; Tolerance: ±2%; Rated Current: 260mA; DC Resistance: 480mΩ; RoHS: Yes; ComponentLink1Description: Datasheet; ComponentLink1URL: https://wmsc.lcsc.com/wmsc/upload/file/pdf/v2/lcsc/2304140030_TDK-MHQ1005P18NGT000_C695589.pdf; ComponentLink2Description: JLCPCB Part URL; ComponentLink2URL: https://jlcpcb.com/partdetail/C695589; ComponentLink3Description: LCSC Part URL; ComponentLink3URL: https://lcsc.com/product-detail/Inductors-SMD_TDK-TDK-MHQ1005P18NGT000_C695589.html
footprint IND-0402 (0402 (1005M) Inductor)
pins: 1, 2

## MHQ1005P18NJT000
designator L?  Inductance: 18nH
Inductor, 18nH, ±5%, 480mΩ, 260mA, SMD 0402; Manufacturer: TDK; Manufacturer Part Number: MHQ1005P18NJT000; Self-Resonant Frequency: 2.3GHz; Q Factor: 22@250MHz; Package Size: 0402; JLCPCB Basic Part: No; JLCPCB Part Number: C434824; Supplier 1: LCSC; Category: Inductors; Supplier Part Number 1: C434824; Tolerance: ±5%; Rated Current: 260mA; DC Resistance: 480mΩ; RoHS: Yes; ComponentLink1Description: Datasheet; ComponentLink1URL: https://wmsc.lcsc.com/wmsc/upload/file/pdf/v2/lcsc/2304140030_TDK-MHQ1005P18NJT000_C434824.pdf; ComponentLink2Description: JLCPCB Part URL; ComponentLink2URL: https://jlcpcb.com/partdetail/C434824; ComponentLink3Description: LCSC Part URL; ComponentLink3URL: https://lcsc.com/product-detail/Inductors-SMD_TDK-TDK-MHQ1005P18NJT000_C434824.html
footprint IND-0402 (0402 (1005M) Inductor)
pins: 1, 2

## MHQ1005P22NGT000
designator L?  Inductance: 22nH
Inductor, 22nH, ±2%, 660mΩ, 230mA, SMD 0402; Manufacturer: TDK; Manufacturer Part Number: MHQ1005P22NGT000; Self-Resonant Frequency: 2.9GHz; Q Factor: 20@250MHz; Package Size: 0402; JLCPCB Basic Part: No; JLCPCB Part Number: C695590; Supplier 1: LCSC; Category: Inductors; Supplier Part Number 1: C695590; Tolerance: ±2%; Rated Current: 230mA; DC Resistance: 660mΩ; RoHS: Yes; ComponentLink1Description: Datasheet; ComponentLink1URL: https://wmsc.lcsc.com/wmsc/upload/file/pdf/v2/lcsc/2304140030_TDK-MHQ1005P22NGT000_C695590.pdf; ComponentLink2Description: JLCPCB Part URL; ComponentLink2URL: https://jlcpcb.com/partdetail/C695590; ComponentLink3Description: LCSC Part URL; ComponentLink3URL: https://lcsc.com/product-detail/Inductors-SMD_TDK-TDK-MHQ1005P22NGT000_C695590.html
footprint IND-0402 (0402 (1005M) Inductor)
pins: 1, 2

## MHQ1005P27NJT000
designator L?  Inductance: 27nH
Inductor, 27nH, ±5%, 660mΩ, 230mA, SMD 0402; Manufacturer: TDK; Manufacturer Part Number: MHQ1005P27NJT000; Self-Resonant Frequency: 2.6GHz; Q Factor: 20@250MHz; Package Size: 0402; JLCPCB Basic Part: No; JLCPCB Part Number: C524923; Supplier 1: LCSC; Category: Inductors; Supplier Part Number 1: C524923; Tolerance: ±5%; Rated Current: 230mA; DC Resistance: 660mΩ; RoHS: Yes; ComponentLink1Description: Datasheet; ComponentLink1URL: https://wmsc.lcsc.com/wmsc/upload/file/pdf/v2/lcsc/2304140030_TDK-MHQ1005P27NJT000_C524923.pdf; ComponentLink2Description: JLCPCB Part URL; ComponentLink2URL: https://jlcpcb.com/partdetail/C524923; ComponentLink3Description: LCSC Part URL; ComponentLink3URL: https://lcsc.com/product-detail/Inductors-SMD_TDK-TDK-MHQ1005P27NJT000_C524923.html
footprint IND-0402 (0402 (1005M) Inductor)
pins: 1, 2

## MHQ1005P33NGTD25
designator L?  Inductance: 33nH
Inductor, 33nH, ±2%, 740mΩ, 220mA, SMD 0402; Manufacturer: TDK; Manufacturer Part Number: MHQ1005P33NGTD25; Self-Resonant Frequency: 2.3GHz; Q Factor: 20@250MHz; Package Size: 0402; JLCPCB Basic Part: No; JLCPCB Part Number: C880690; Supplier 1: LCSC; Category: Inductors; Supplier Part Number 1: C880690; Tolerance: ±2%; Rated Current: 220mA; DC Resistance: 740mΩ; RoHS: Yes; ComponentLink1Description: Datasheet; ComponentLink1URL: https://wmsc.lcsc.com/wmsc/upload/file/pdf/v2/lcsc/2010170834_TDK-MHQ1005P33NGTD25_C880690.pdf; ComponentLink2Description: JLCPCB Part URL; ComponentLink2URL: https://jlcpcb.com/partdetail/C880690; ComponentLink3Description: LCSC Part URL; ComponentLink3URL: https://lcsc.com/product-detail/Inductors-SMD_TDK-TDK-MHQ1005P33NGTD25_C880690.html
footprint IND-0402 (0402 (1005M) Inductor)
pins: 1, 2

## MHQ1005P39NJT000
designator L?  Inductance: 39nH
Inductor, 39nH, ±5%, 950mΩ, 190mA, SMD 0402; Manufacturer: TDK; Manufacturer Part Number: MHQ1005P39NJT000; Self-Resonant Frequency: 1.4GHz; Q Factor: 20@250MHz; Package Size: 0402; JLCPCB Basic Part: No; JLCPCB Part Number: C531399; Supplier 1: LCSC; Category: Inductors; Supplier Part Number 1: C531399; Tolerance: ±5%; Rated Current: 190mA; DC Resistance: 950mΩ; RoHS: Yes; ComponentLink1Description: Datasheet; ComponentLink1URL: https://wmsc.lcsc.com/wmsc/upload/file/pdf/v2/lcsc/2401221724_TDK-MHQ1005P39NJT000_C531399.pdf; ComponentLink2Description: JLCPCB Part URL; ComponentLink2URL: https://jlcpcb.com/partdetail/C531399; ComponentLink3Description: LCSC Part URL; ComponentLink3URL: https://lcsc.com/product-detail/Inductors-SMD_TDK-TDK-MHQ1005P39NJT000_C531399.html
footprint IND-0402 (0402 (1005M) Inductor)
pins: 1, 2

## MHQ1005P43NGT000
designator L?  Inductance: 43nH
Inductor, 43nH, ±2%, 1.06Ω, 190mA, SMD 0402; Manufacturer: TDK; Manufacturer Part Number: MHQ1005P43NGT000; Self-Resonant Frequency: 2GHz; Q Factor: 22@250MHz; Package Size: 0402; JLCPCB Basic Part: No; JLCPCB Part Number: C695591; Supplier 1: LCSC; Category: Inductors; Supplier Part Number 1: C695591; Tolerance: ±2%; Rated Current: 190mA; DC Resistance: 1.06Ω; RoHS: Yes; ComponentLink1Description: Datasheet; ComponentLink1URL: https://wmsc.lcsc.com/wmsc/upload/file/pdf/v2/lcsc/2304140030_TDK-MHQ1005P43NGT000_C695591.pdf; ComponentLink2Description: JLCPCB Part URL; ComponentLink2URL: https://jlcpcb.com/partdetail/C695591; ComponentLink3Description: LCSC Part URL; ComponentLink3URL: https://lcsc.com/product-detail/Inductors-SMD_TDK-TDK-MHQ1005P43NGT000_C695591.html
footprint IND-0402 (0402 (1005M) Inductor)
pins: 1, 2

## MHQ1005P47NJT000
designator L?  Inductance: 47nH
Inductor, 47nH, ±5%, 1.09Ω, 190mA, SMD 0402; Manufacturer: TDK; Manufacturer Part Number: MHQ1005P47NJT000; Self-Resonant Frequency: 1.3GHz; Q Factor: 22@250MHz; Package Size: 0402; JLCPCB Basic Part: No; JLCPCB Part Number: C445743; Supplier 1: LCSC; Category: Inductors; Supplier Part Number 1: C445743; Tolerance: ±5%; Rated Current: 190mA; DC Resistance: 1.09Ω; RoHS: Yes; ComponentLink1Description: Datasheet; ComponentLink1URL: https://wmsc.lcsc.com/wmsc/upload/file/pdf/v2/lcsc/2304140030_TDK-MHQ1005P47NJT000_C445743.pdf; ComponentLink2Description: JLCPCB Part URL; ComponentLink2URL: https://jlcpcb.com/partdetail/C445743; ComponentLink3Description: LCSC Part URL; ComponentLink3URL: https://lcsc.com/product-detail/Inductors-SMD_TDK-TDK-MHQ1005P47NJT000_C445743.html
footprint IND-0402 (0402 (1005M) Inductor)
pins: 1, 2

## MHQ1005P51NJT000
designator L?  Inductance: 51nH
Inductor, 51nH, ±5%, 1.17Ω, 190mA, SMD 0402; Manufacturer: TDK; Manufacturer Part Number: MHQ1005P51NJT000; Self-Resonant Frequency: 1.8GHz; Q Factor: 22@250MHz; Package Size: 0402; JLCPCB Basic Part: No; JLCPCB Part Number: C480646; Supplier 1: LCSC; Category: Inductors; Supplier Part Number 1: C480646; Tolerance: ±5%; Rated Current: 190mA; DC Resistance: 1.17Ω; RoHS: Yes; ComponentLink1Description: Datasheet; ComponentLink1URL: https://wmsc.lcsc.com/wmsc/upload/file/pdf/v2/lcsc/2304140030_TDK-MHQ1005P51NJT000_C480646.pdf; ComponentLink2Description: JLCPCB Part URL; ComponentLink2URL: https://jlcpcb.com/partdetail/C480646; ComponentLink3Description: LCSC Part URL; ComponentLink3URL: https://lcsc.com/product-detail/Inductors-SMD_TDK-TDK-MHQ1005P51NJT000_C480646.html
footprint IND-0402 (0402 (1005M) Inductor)
pins: 1, 2

## MHQ1005P68NJT000
designator L?  Inductance: 68nH
Inductor, 68nH, ±5%, 1.43Ω, 160mA, SMD 0402; Manufacturer: TDK; Manufacturer Part Number: MHQ1005P68NJT000; Self-Resonant Frequency: 1.1GHz; Q Factor: 22@250MHz; Package Size: 0402; JLCPCB Basic Part: No; JLCPCB Part Number: C445741; Supplier 1: LCSC; Category: Inductors; Supplier Part Number 1: C445741; Tolerance: ±5%; Rated Current: 160mA; DC Resistance: 1.43Ω; RoHS: Yes; ComponentLink1Description: Datasheet; ComponentLink1URL: https://wmsc.lcsc.com/wmsc/upload/file/pdf/v2/lcsc/2304140030_TDK-MHQ1005P68NJT000_C445741.pdf; ComponentLink2Description: JLCPCB Part URL; ComponentLink2URL: https://jlcpcb.com/partdetail/C445741; ComponentLink3Description: LCSC Part URL; ComponentLink3URL: https://lcsc.com/product-detail/Inductors-SMD_TDK-TDK-MHQ1005P68NJT000_C445741.html
footprint IND-0402 (0402 (1005M) Inductor)
pins: 1, 2

## MHQ1005PR12GT000
designator L?  Inductance: 120nH
Inductor, 120nH, ±2%, 1.81Ω, 140mA, SMD 0402; Manufacturer: TDK; Manufacturer Part Number: MHQ1005PR12GT000; Self-Resonant Frequency: 1.2GHz; Q Factor: 22@250MHz; Package Size: 0402; JLCPCB Basic Part: No; JLCPCB Part Number: C695592; Supplier 1: LCSC; Category: Inductors; Supplier Part Number 1: C695592; Tolerance: ±2%; Rated Current: 140mA; DC Resistance: 1.81Ω; RoHS: Yes; ComponentLink1Description: Datasheet; ComponentLink1URL: https://wmsc.lcsc.com/wmsc/upload/file/pdf/v2/lcsc/2304140030_TDK-MHQ1005PR12GT000_C695592.pdf; ComponentLink2Description: JLCPCB Part URL; ComponentLink2URL: https://jlcpcb.com/partdetail/C695592; ComponentLink3Description: LCSC Part URL; ComponentLink3URL: https://lcsc.com/product-detail/Inductors-SMD_TDK-TDK-MHQ1005PR12GT000_C695592.html
footprint IND-0402 (0402 (1005M) Inductor)
pins: 1, 2

## MHQ1005PR12JT000
designator L?  Inductance: 120nH
Inductor, 120nH, ±5%, 1.81Ω, 140mA, SMD 0402; Manufacturer: TDK; Manufacturer Part Number: MHQ1005PR12JT000; Self-Resonant Frequency: 800MHz; Q Factor: 22@250MHz; Package Size: 0402; JLCPCB Basic Part: No; JLCPCB Part Number: C695593; Supplier 1: LCSC; Category: Inductors; Supplier Part Number 1: C695593; Tolerance: ±5%; Rated Current: 140mA; DC Resistance: 1.81Ω; RoHS: Yes; ComponentLink1Description: Datasheet; ComponentLink1URL: https://wmsc.lcsc.com/wmsc/upload/file/pdf/v2/lcsc/2007171934_TDK-MHQ1005PR12JT000_C695593.pdf; ComponentLink2Description: JLCPCB Part URL; ComponentLink2URL: https://jlcpcb.com/partdetail/C695593; ComponentLink3Description: LCSC Part URL; ComponentLink3URL: https://lcsc.com/product-detail/Inductors-SMD_TDK-TDK-MHQ1005PR12JT000_C695593.html
footprint IND-0402 (0402 (1005M) Inductor)
pins: 1, 2

## MHQ1005PR15JT000
designator L?  Inductance: 150nH
Inductor, 150nH, ±5%, 2.03Ω, 110mA, SMD 0402; Manufacturer: TDK; Manufacturer Part Number: MHQ1005PR15JT000; Self-Resonant Frequency: 1GHz; Q Factor: 22@250MHz; Package Size: 0402; JLCPCB Basic Part: No; JLCPCB Part Number: C413899; Supplier 1: LCSC; Category: Inductors; Supplier Part Number 1: C413899; Tolerance: ±5%; Rated Current: 110mA; DC Resistance: 2.03Ω; RoHS: Yes; ComponentLink1Description: Datasheet; ComponentLink1URL: https://wmsc.lcsc.com/wmsc/upload/file/pdf/v2/lcsc/2304140030_TDK-MHQ1005PR15JT000_C413899.pdf; ComponentLink2Description: JLCPCB Part URL; ComponentLink2URL: https://jlcpcb.com/partdetail/C413899; ComponentLink3Description: LCSC Part URL; ComponentLink3URL: https://lcsc.com/product-detail/Inductors-SMD_TDK-TDK-MHQ1005PR15JT000_C413899.html
footprint IND-0402 (0402 (1005M) Inductor)
pins: 1, 2